# Altium footprint library 1MaxPcb.PcbLib: 187 footprints (part 12 of 12)
Each footprint in its own frame and in the unit in brackets; x right, y up, seen from the top. Pads: shape width x height; smd on the part's side, far side on the other; paste and mask are expansions set on the pad; w line width, h text height; cw(c..) or ccw(c..) is an arc to the next point about the centre after c.
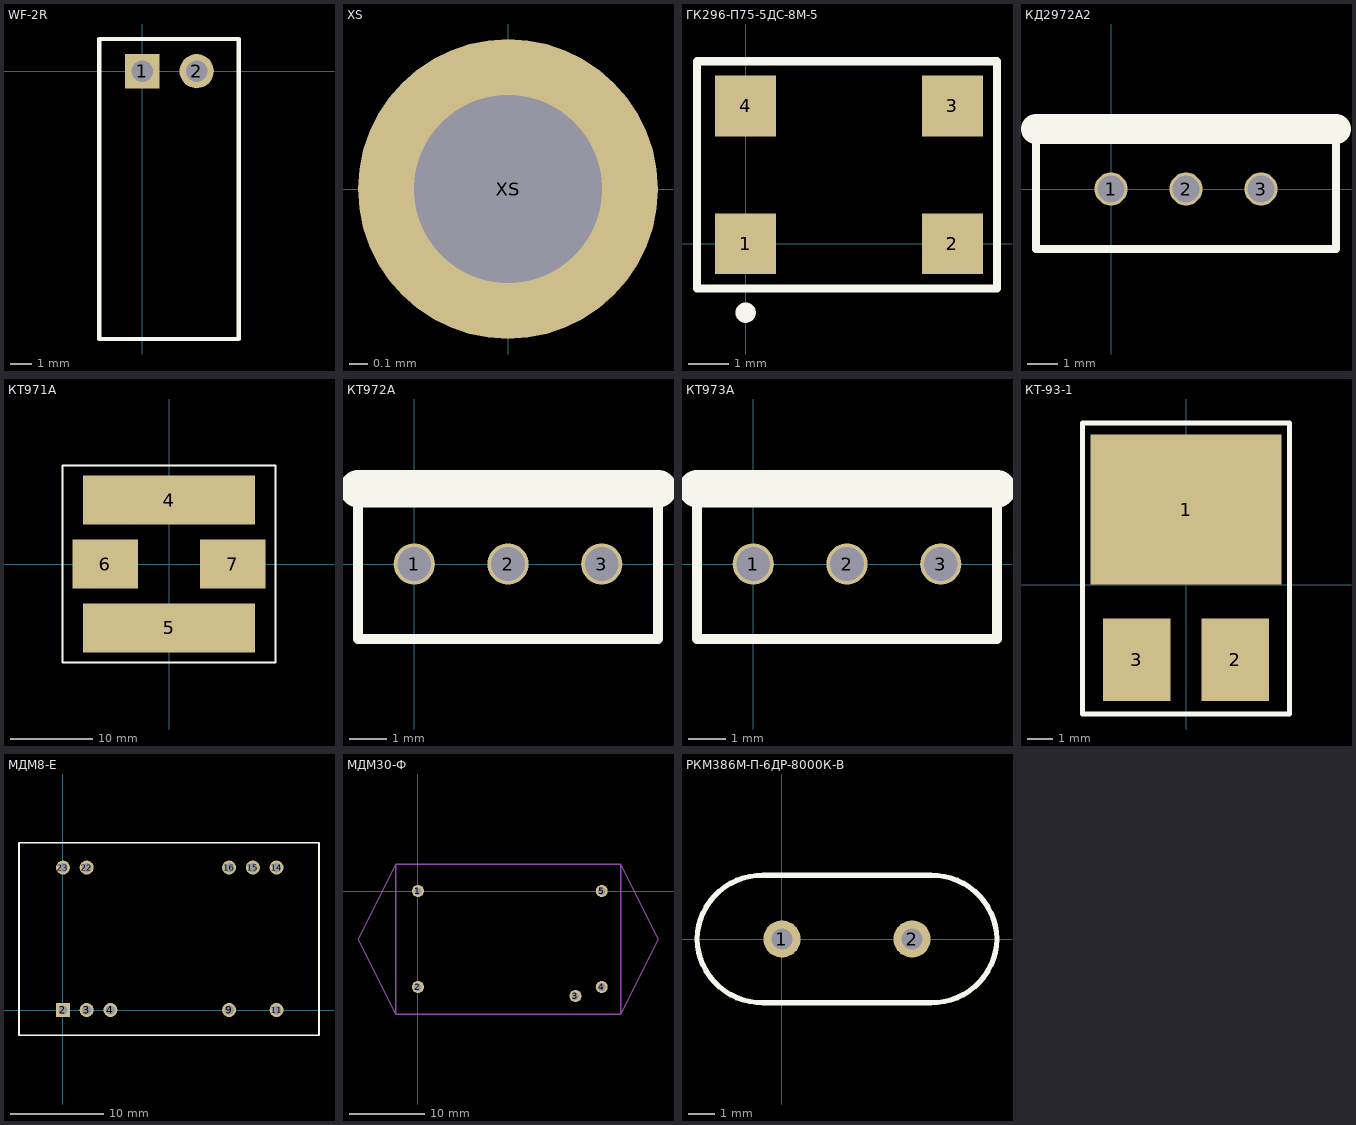
[diagram p11: the footprints below, top view; thin cyan lines are the x and y axes]

## WF-2R [mm] "2510 CONNCETOR PITCH 2.54mm"
pads (2):
  rect 1.6x1.6 hole 1: 1(0,0)
  round 1.6 hole 1: 2(2.54,0)
Top Overlay:
  lines w0.2: -2,-12.5 4.5,-12.5 4.5,1.5 -2,1.5 -2,-12.5
3D body "User Library-WF-2R__ _________.STEP": height 5.8, standoff -3.4, extent -1.27,-12.87 3.81,0.33

## XS [mm] "Просто круглая дырка нафиг."
height 0.6
pads (1):
  round 1.6 hole 1 mask+0.05: XS(0,0)

## ГК296-П75-5ДС-8М-5 [mm]
height 1.8
pads (4):
  rect 1.5x1.5 smd paste-25.4: 1(0,0) 2(5.1,0) 3(5.1,3.4) 4(0,3.4)
Top Overlay:
  circle w0.3: c0,-1.7 r0.1
  lines w0.2: -1.2,-1.1 -1.2,4.5 6.2,4.5 6.2,-1.1 -1.2,-1.1
3D body "User Library-ECS-3951.STEP": height 1.7, standoff 0, extent -1,-0.801 6,4.201

## КД2972А2 [mm]
pads (3):
  round 1.1 hole 0.9 paste+0 mask+0.1: 1(0,0) 2(2.5,0) 3(5,0)
Top Overlay:
  lines w0.254: -2.5,2 -2.5,-2 7.5,-2 7.5,2
  lines w1: -2.5,2 7.5,2

## КТ971А [mm]
pads (4):
  rect 21x6 smd paste+0 mask+0.1: 4(0,7.8) 5(0,-7.8)
  rect 8x6 smd paste+0 mask+0.1: 6(-7.8,0) 7(7.8,0)
Top Overlay:
  lines w0.254: -13,-12 13,-12 13,12 -13,12 -13,0 -13,-12

## КТ972А [mm]
pads (3):
  round 1.1 hole 0.9 paste+0 mask+0.1: 1(0,0) 2(2.5,0) 3(5,0)
Top Overlay:
  lines w0.254: -1.5,2 -1.5,-2 6.5,-2 6.5,2
  lines w1: -1.5,2 6.5,2

## КТ973А [mm]
pads (3):
  round 1.1 hole 0.9 paste+0 mask+0.1: 1(0,0) 2(2.5,0) 3(5,0)
Top Overlay:
  lines w0.254: -1.5,2 -1.5,-2 6.5,-2 6.5,2
  lines w1: -1.5,2 6.5,2

## КТ-93-1 [mm]
height 0.6
pads (3):
  rect 7.4x5.8 smd: 1(0,2.9)
  rect 2.6x3.2 smd: 2(1.9,-2.9) 3(-1.9,-2.9)
Top Overlay:
  lines w0.2: -4,-5 4,-5 4,6.25 -4,6.25 -4,-5
3D body "KT-93-1.stp": height 3, standoff 0, extent -3.75,-4.45 3.75,5.65

## МДМ8-Е [mm] "DC/DC с широким входным напряжением"
pads (10):
  rect 1.5x1.5 hole 1: 2(0,0)
  round 1.5 hole 1: 3(2.54,0) 4(5.08,0) 9(17.78,0) 11(22.86,0) 14(22.86,15.24) 15(20.32,15.24) 16(17.78,15.24) 22(2.54,15.24) 23(0,15.24)
Top Overlay:
  lines w0.2: -4.7,-2.7 27.4,-2.7 27.4,17.9 -4.7,17.9 -4.7,-2.7
3D body "мдм8.stp": height 10.1, standoff -3.8, extent -4.525,-2.525 27.275,17.775

## МДМ30-Ф [mm] "DC/DC Кконвертор"
pads (5):
  round 1.6 hole 1: 1(0,0) 2(0,-12.8) 3(21,-14) 4(24.5,-12.8) 5(24.5,0)
Bottom Overlay:
  lines w0.2: -3.5,-16.9 -3.5,4.1 27.5,4.1 27.5,-16.9 -3.5,-16.9
Mechanical 13:
  lines w0.2: -3,-16.4 27,-16.4 ; -3,-16.4 -3,3.6 ; -3,-16.4 -8,-6.4 -3,3.6 ; -3,3.6 27,3.6 ; 27,-16.4 32,-6.4 27,3.6 ; 27,-16.4 27,3.6
3D body: height -9.8, standoff -11.8, extent 27,-16.4 32,3.6
3D body: height -9.8, standoff -11.8, extent -8,-16.4 -3,3.6
3D body: height -1.6, standoff -11.8, extent -3,-16.4 27,3.6
3D body: height 1.9, standoff -1.55, extent -0.248,-0.249 0.25,0.25
3D body: height 1.9, standoff -1.55, extent -0.248,-13.049 0.25,-12.55
3D body: height 1.9, standoff -1.55, extent 24.252,-13.049 24.75,-12.55
3D body: height 1.9, standoff -1.55, extent 24.252,-0.249 24.75,0.25
3D body: height 1.9, standoff -1.55, extent 20.752,-14.249 21.25,-13.75

## РКМ386М-П-6ДР-8000К-В [mm] "Резонатор пьезоэлектрический миниатюрный РКМ386М"
pads (2):
  round 1.4 hole 0.8: 1(0,0) 2(4.9,0)
Top Overlay:
  lines w0.2: -3.2,0 ccw(c-0.75,0.05) -0.7,-2.4 5.6,-2.4 ccw(c5.65,0.05) 8.1,0 ccw(c5.65,-0.05) 5.6,2.4 -0.7,2.4 ccw(c-0.75,-0.05) -3.2,0
3D body "User Library-HC49U-1.STEP": height 13.6, standoff -2.9, extent -3.05,-2.245 7.93,2.246